# Altium footprint library CUSTOM PCB.PcbLib: 404 footprints (part 8 of 26)
Each footprint in its own frame and in the unit in brackets; x right, y up, seen from the top. Pads: shape width x height; smd on the part's side, far side on the other; paste and mask are expansions set on the pad; w line width, h text height; cw(c..) or ccw(c..) is an arc to the next point about the centre after c.
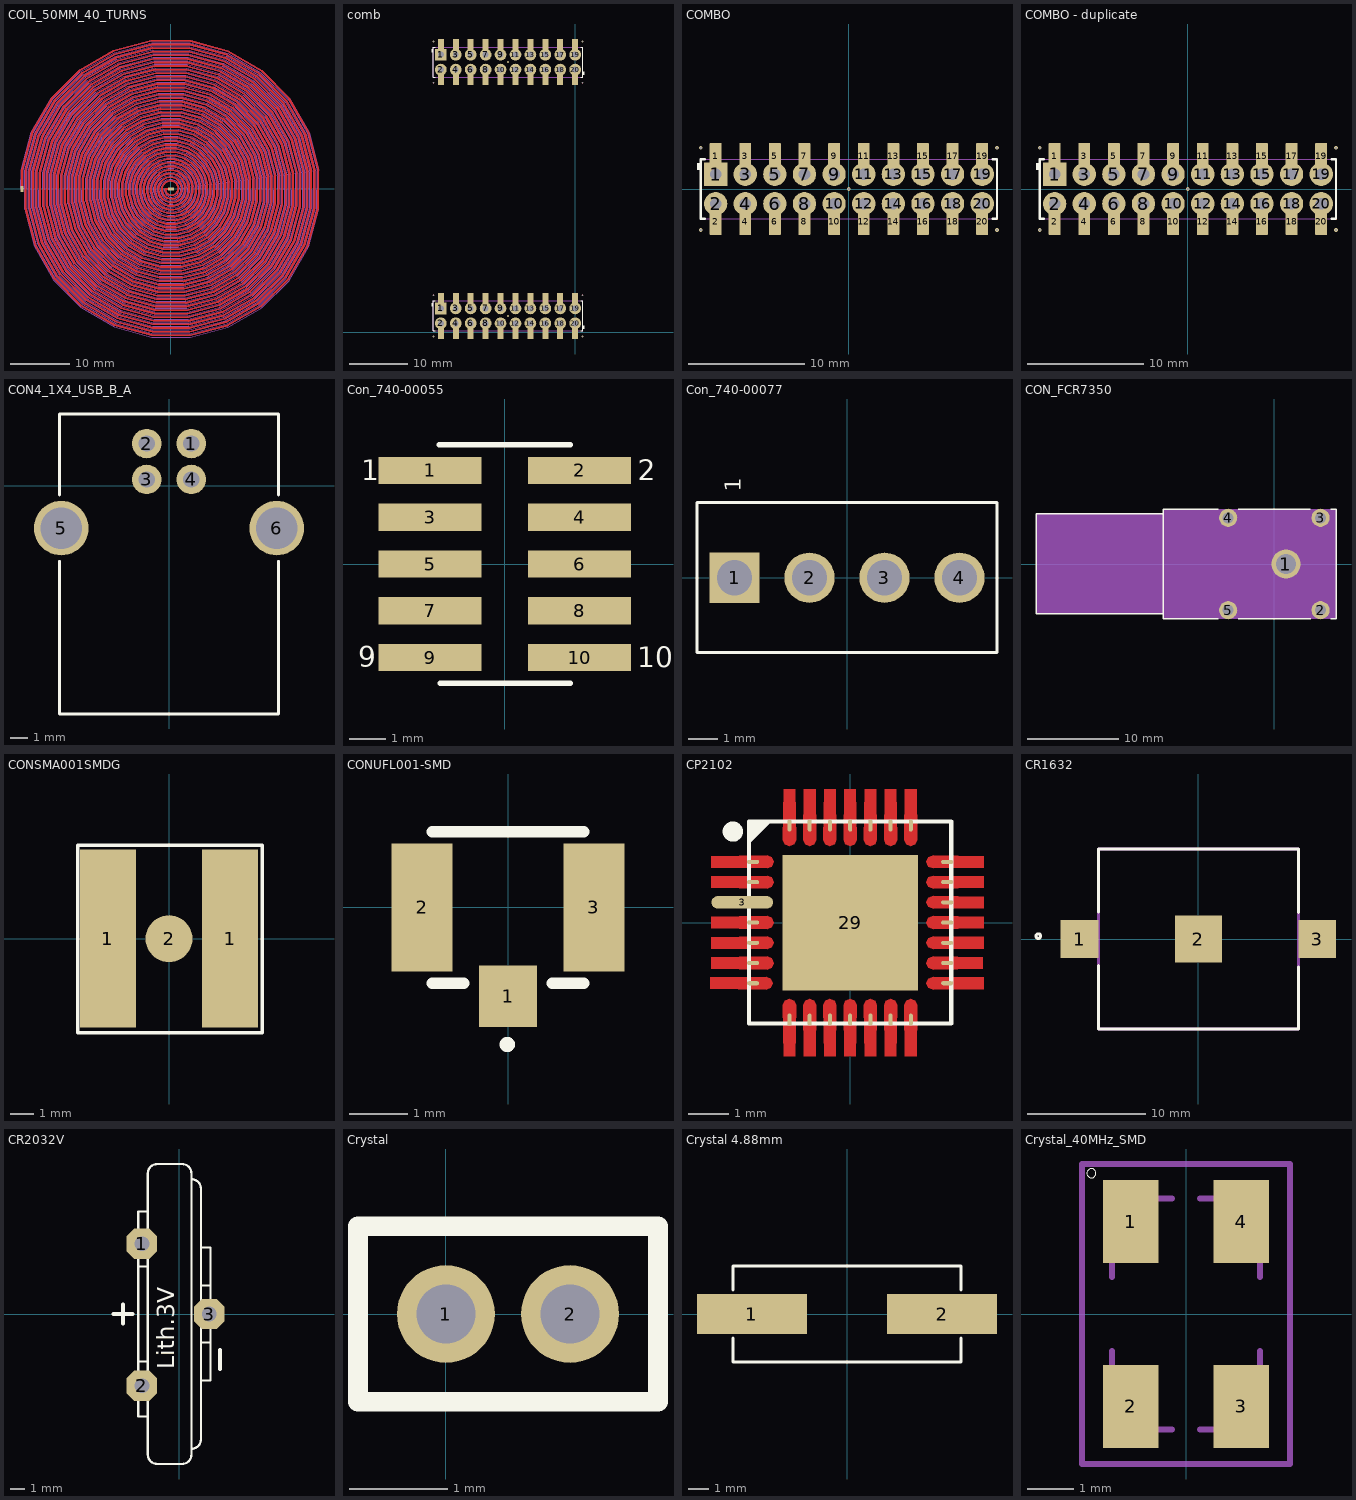
[diagram p7: the footprints below, top view; thin cyan lines are the x and y axes]

## COIL_50MM_40_TURNS [mm]
pads (2):
  rect 0.5x1 smd: 1(-24.972,0.002)
  rect 1x0.5 smd: 2(0.032,0.002)
Top Layer:
  lines w0.297: -24.972,0.002 -24.947,3.29 -23.221,9.632 -19.917,15.306 -15.261,19.927 -9.573,23.182 -3.243,24.852 3.297,24.827 9.601,23.112 15.241,19.826 19.833,15.198 23.068,9.545 24.728,3.253 24.703,-3.247 22.998,-9.513 19.733,-15.118 15.133,-19.683 9.514,-22.898 3.261,-24.547 -3.2,-24.522 -9.428,-22.828 -14.999,-19.582 -19.535,-15.01 -22.731,-9.425 -24.37,-3.21 -24.345,3.211 -22.661,9.4 -19.435,14.937 -14.891,19.445 -9.341,22.621 -3.164,24.25 3.218,24.225 9.369,22.551 14.871,19.345 19.352,14.829 22.507,9.313 24.126,3.174 24.101,-3.168 22.437,-9.28 19.251,-14.748 14.763,-19.201 9.281,-22.337 3.181,-23.945 -3.121,-23.92 -9.195,-22.267 -14.629,-19.101 -19.054,-14.641 -22.17,-9.193 -23.768,-3.131 -23.743,3.131 -22.1,9.167 -18.953,14.567 -14.521,18.963 -9.108,22.06 -3.084,23.648 3.138,23.623 9.136,21.99 14.501,18.863 18.87,14.459 21.946,9.08 23.524,3.095 23.499,-3.088 21.876,-9.048 18.77,-14.379 14.394,-18.719 9.049,-21.776 3.102,-23.343 -3.042,-23.318 -8.963,-21.706 -14.259,-18.619 -18.572,-14.271 -21.609,-8.961 -23.166,-3.052 -23.141,3.052 -21.539,8.935 -18.472,14.197 -14.152,18.482 -8.876,21.499 -3.005,23.046 3.059,23.021 8.904,21.429 14.132,18.381 18.388,14.09 21.385,8.848 22.922,3.016 22.897,-3.009 21.315,-8.816 18.288,-14.009 14.024,-18.237 8.817,-21.215 3.023,-22.741 -2.962,-22.716 -8.731,-21.145 -13.89,-18.137 -18.09,-13.901 -21.048,-8.728 -22.564,-2.973 -22.539,2.973 -20.978,8.703 -17.99,13.828 -13.782,18 -8.643,20.938 -2.926,22.444 2.98,22.419 8.672,20.868 13.762,17.9 17.906,13.72 20.824,8.616 22.32,2.936 22.295,-2.93 20.754,-8.583 17.806,-13.639 13.654,-17.756 8.584,-20.654 2.944,-22.139 -2.883,-22.114 -8.498,-20.584 -13.52,-17.655 -17.608,-13.532 -20.487,-8.496 -21.962,-2.893 -21.937,2.894 -20.417,8.47 -17.508,13.458 -13.412,17.518 -8.411,20.377 -2.847,21.842 2.901,21.817 8.439,20.307 13.393,17.418 17.425,13.35 20.264,8.383 21.718,2.857 21.693,-2.851 20.193,-8.351 17.324,-13.27 13.285,-17.274 8.352,-20.093 2.864,-21.537 -2.804,-21.512 -8.266,-20.023 -13.151,-17.174 -17.127,-13.162 -19.926,-8.264 -21.36,-2.814 -21.335,2.814 -19.856,8.238 -17.026,13.088 -13.043,17.037 -8.179,19.816 -2.767,21.24 2.821,21.215 8.207,19.746 13.023,16.936 16.943,12.981 19.703,8.151 21.116,2.778 21.091,-2.771 19.632,-8.118 16.843,-12.9 12.915,-16.792 8.12,-19.532 2.785,-20.935 -2.725,-20.91 -8.034,-19.462 -12.781,-16.692 -16.645,-12.792 -19.365,-8.031 -20.758,-2.735 -20.733,2.735 -19.295,8.006 -16.545,12.719 -12.673,16.555 -7.946,19.255 -2.688,20.638 2.742,20.613 7.974,19.185 12.653,16.455 16.461,12.611 19.142,7.919 20.514,2.699 20.489,-2.692 19.071,-7.886 16.361,-12.531 12.545,-16.311 7.887,-18.971 2.706,-20.334 -2.645,-20.308 -7.801,-18.901 -12.411,-16.21 -16.163,-12.423 -18.804,-7.799 -20.156,-2.656 -20.131,2.656 -18.734,7.773 -16.063,12.349 -12.304,16.073 -7.714,18.694 -2.609,20.036 2.663,20.011 7.742,18.624 12.284,15.973 15.98,12.241 18.581,7.686 19.912,2.619 19.887,-2.613 18.511,-7.654 15.879,-12.161 12.176,-15.829 7.655,-18.41 2.627,-19.732 -2.566,-19.706 -7.569,-18.34 -12.042,-15.729 -15.682,-12.053 -18.243,-7.567 -19.554,-2.576 -19.529,2.577 -18.173,7.541 -15.581,11.98 -11.934,15.591 -7.482,18.133 -2.53,19.434 2.584,19.409 7.51,18.063 11.914,15.491 15.498,11.872 18.02,7.454 19.31,2.54 19.285,-2.533 17.95,-7.421 15.398,-11.791 11.806,-15.347 7.423,-17.849 2.547,-19.13 -2.487,-19.104 -7.336,-17.779 -11.672,-15.247 -15.2,-11.684 -17.682,-7.334 -18.952,-2.497 -18.927,2.497 -17.612,7.309 -15.1,11.61 -11.564,15.11 -7.249,17.572 -2.45,18.832 2.504,18.807 7.277,17.502 11.544,15.009 15.016,11.502 17.459,7.221 18.708,2.461 18.683,-2.454 17.389,-7.189 14.916,-11.422 11.437,-14.866 7.19,-17.288 2.468,-18.528 -2.408,-18.502 -7.104,-17.218 -11.302,-14.765 -14.718,-11.314 -17.121,-7.102 -18.35,-2.418 -18.325,2.418 -17.051,7.076 -14.618,11.24 -11.195,14.628 -7.017,17.011 -2.371,18.23 2.425,18.205 7.045,16.941 11.175,14.528 14.535,11.133 16.898,6.989 18.106,2.382 18.081,-2.375 16.828,-6.957 14.434,-11.052 11.067,-14.384 6.958,-16.727 2.389,-17.926 -2.328,-17.901 -6.872,-16.657 -10.933,-14.283 -14.237,-10.944 -16.56,-6.87 -17.748,-2.339 -17.723,2.339 -16.49,6.844 -14.136,10.871 -10.825,14.146 -6.785,16.45 -2.292,17.628 2.346,17.603 6.813,16.38 10.805,14.046 14.053,10.763 16.337,6.757 17.504,2.302 17.479,-2.296 16.267,-6.724 13.952,-10.683 10.697,-13.902 6.726,-16.166 2.309,-17.324 -2.249,-17.299 -6.639,-16.096 -10.563,-13.802 -13.755,-10.575 -15.999,-6.637 -17.146,-2.259 -17.121,2.259 -15.929,6.612 -13.654,10.501 -10.455,13.665 -6.552,15.889 -2.213,17.026 2.267,17.001 6.58,15.819 10.436,13.564 13.571,10.393 15.776,6.524 16.902,2.223 16.877,-2.216 15.706,-6.492 13.471,-10.313 10.328,-13.42 6.493,-15.605 2.23,-16.722 -2.17,-16.697 -6.407,-15.535 -10.194,-13.32 -13.273,-10.205 -15.438,-6.405 -16.544,-2.18 -16.519,2.18 -15.368,6.379 -13.173,10.131 -10.086,13.183 -6.32,15.328 -2.133,16.424 2.187,16.399 6.348,15.258 10.066,13.083 13.089,10.024 15.215,6.292 16.3,2.144 16.275,-2.137 15.145,-6.26 12.989,-9.943 9.958,-12.939 6.261,-15.044 2.151,-16.12 -2.091,-16.095 -6.175,-14.974 -9.824,-12.838 -12.791,-9.835 -14.877,-6.173 -15.942,-2.101 -15.917,2.101 -14.807,6.147 -12.691,9.762 -9.716,12.701 -6.088,14.767 -2.054,15.822 2.108,15.797 6.116,14.697 9.696,12.601 12.608,9.654 14.654,6.06 15.698,2.065 15.673,-2.058 14.584,-6.027 12.507,-9.574 9.588,-12.457 6.029,-14.483 2.072,-15.518 -2.011,-15.493 -5.942,-14.413 -9.454,-12.357 -12.31,-9.466 -14.316,-5.94 -15.34,-2.022 -15.315,2.022 -14.246,5.914 -12.209,9.392 -9.347,12.22 -5.855,14.206 -1.975,15.22 2.029,15.195 5.883,14.136 9.327,12.119 12.126,9.284 14.093,5.827 15.096,1.985 15.071,-1.979 14.023,-5.795 12.026,-9.204 9.219,-11.975 5.796,-13.922 1.992,-14.916 -1.932,-14.891 -5.71,-13.852 -9.085,-11.875 -11.828,-9.096 -13.755,-5.708 -14.738,-1.942 -14.713,1.942 -13.685,5.682 -11.728,9.023 -8.977,11.738 -5.623,13.645 -1.896,14.618 1.95,14.593 5.651,13.575 8.957,11.638 11.644,8.915 13.532,5.595 14.494,1.906 14.469,-1.899 13.462,-5.563 11.544,-8.834 8.849,-11.494 5.564,-13.362 1.913,-14.314 -1.853,-14.289 -5.478,-13.291 -8.715,-11.393 -11.346,-8.727 -13.194,-5.475 -14.136,-1.863 -14.111,1.863 -13.124,5.45 -11.246,8.653 -8.607,11.256 -5.39,13.084 -1.816,14.016 1.87,13.991 5.419,13.014 8.587,11.156 11.163,8.545 12.971,5.363 13.893,1.827 13.867,-1.82 12.901,-5.33 11.062,-8.465 8.48,-11.012 5.331,-12.801 1.834,-13.712 -1.774,-13.687 -5.245,-12.73 -8.345,-10.912 -10.865,-8.357 -12.633,-5.243 -13.534,-1.784 -13.509,1.784 -12.563,5.217 -10.764,8.283 -8.238,10.774 -5.158,12.523 -1.737,13.414 1.791,13.389 5.186,12.453 8.218,10.674 10.681,8.176 12.41,5.13 13.291,1.748 13.265,-1.741 12.34,-5.098 10.581,-8.095 8.11,-10.53 5.099,-12.24 1.755,-13.11 -1.694,-13.085 -5.013,-12.169 -7.976,-10.43 -10.383,-7.987 -12.072,-5.011 -12.932,-1.705 -12.907,1.705 -12.002,4.985 -10.283,7.914 -7.868,10.293 -4.926,11.963 -1.658,12.812 1.712,12.787 4.954,11.892 7.848,10.192 10.199,7.806 11.849,4.898 12.689,1.668 12.663,-1.662 11.779,-4.866 10.099,-7.726 7.74,-10.049 4.867,-11.679 1.675,-12.508 -1.615,-12.483 -4.781,-11.609 -7.606,-9.948 -9.901,-7.618 -11.512,-4.778 -12.33,-1.625 -12.305,1.625 -11.441,4.753 -9.801,7.544 -7.498,9.811 -4.693,11.402 -1.579,12.21 1.633,12.185 4.722,11.331 7.479,9.711 9.718,7.436 11.288,4.666 12.087,1.589 12.061,-1.582 11.218,-4.633 9.617,-7.356 7.371,-9.567 4.634,-11.118 1.596,-11.906 -1.536,-11.881 -4.548,-11.048 -7.237,-9.466 -9.42,-7.248 -10.951,-4.546 -11.728,-1.546 -11.703,1.546 -10.88,4.52 -9.319,7.174 -7.129,9.329 -4.461,10.841 -1.499,11.608 1.553,11.583 4.489,10.77 7.109,9.229 9.236,7.067 10.727,4.433 11.485,1.51 11.459,-1.503 10.657,-4.401 9.135,-6.986 7.001,-9.085 4.402,-10.557 1.517,-11.304 -1.457,-11.279 -4.316,-10.487 -6.867,-8.985 -8.938,-6.878 -10.39,-4.314 -11.126,-1.467 -11.101,1.467 -10.319,4.288 -8.837,6.805 -6.759,8.848 -4.229,10.28 -1.42,11.006 1.474,10.981 4.257,10.21 6.739,8.747 8.754,6.697 10.166,4.201 10.883,1.431 10.858,-1.424 10.096,-4.168 8.654,-6.617 6.632,-8.603 4.17,-9.996 1.438,-10.702 -1.377,-10.677 -4.083,-9.926 -6.497,-8.503 -8.456,-6.509 -9.829,-4.081 -10.524,-1.388 -10.499,1.388 -9.759,4.056 -8.356,6.435 -6.39,8.366 -3.996,9.719 -1.341,10.404 1.395,10.379 4.024,9.649 6.37,8.266 8.272,6.327 9.605,3.969 10.281,1.351 10.256,-1.345 9.535,-3.936 8.172,-6.247 6.262,-8.122 3.937,-9.435 1.358,-10.1 -1.298,-10.075 -3.851,-9.365 -6.128,-8.021 -7.974,-6.139 -9.268,-3.849 -9.922,-1.308 -9.897,1.308 -9.198,3.823 -7.874,6.066 -6.02,7.884 -3.764,9.158 -1.262,9.802 1.316,9.777 3.792,9.088 6,7.784 7.791,5.958 9.044,3.736 9.679,1.272 9.654,-1.265 8.974,-3.704 7.69,-5.877 5.892,-7.64 3.705,-8.874 1.279,-9.498 -1.219,-9.473 -3.619,-8.804 -5.758,-7.54 -7.493,-5.77 -8.707,-3.617 -9.321,-1.229 -9.295,1.229 -8.637,3.591 -7.392,5.696 -5.65,7.403 -3.532,8.597 -1.182,9.2 1.236,9.175 3.56,8.527 5.63,7.302 7.309,5.588 8.483,3.504 9.077,1.193 9.052,-1.186 8.413,-3.471 7.209,-5.508 5.523,-7.158 3.473,-8.313 1.2,-8.896 -1.14,-8.871 -3.386,-8.243 -5.388,-7.058 -7.011,-5.4 -8.146,-3.384 -8.719,-1.15 -8.693,1.15 -8.076,3.359 -6.911,5.326 -5.281,6.921 -3.299,8.036 -1.103,8.598 1.157,8.573 3.327,7.966 5.261,6.82 6.827,5.219 7.922,3.271 8.475,1.114 8.45,-1.107 7.852,-3.239 6.727,-5.138 5.153,-6.677 3.24,-7.752 1.121,-8.294 -1.06,-8.269 -3.154,-7.682 -5.019,-6.576 -6.529,-5.03 -7.585,-3.152 -8.117,-1.071 -8.091,1.071 -7.515,3.126 -6.429,4.957 -4.911,6.439 -3.067,7.475 -1.024,7.996 1.078,7.971 3.095,7.405 4.891,6.339 6.346,4.849 7.362,3.039 7.873,1.034 7.848,-1.028 7.291,-3.007 6.245,-4.769 4.783,-6.195 3.008,-7.191 1.041,-7.692 -0.981,-7.667 -2.922,-7.121 -4.649,-6.095 -6.048,-4.661 -7.024,-2.92 -7.515,-0.991 -7.489,0.991 -6.954,2.894 -5.947,4.587 -4.541,5.957 -2.835,6.914 -0.945,7.394 0.999,7.369 2.863,6.844 4.522,5.857 5.864,4.479 6.801,2.807 7.271,0.955 7.246,-0.948 6.73,-2.774 5.764,-4.399 4.414,-5.713 2.776,-6.63 0.962,-7.09 -0.902,-7.065 -2.689,-6.56 -4.28,-5.613 -5.566,-4.291 -6.463,-2.687 -6.913,-0.912 -6.887,0.912 -6.393,2.662 -5.466,4.217 -4.172,5.476 -2.602,6.353 -0.865,6.792 0.919,6.767 2.63,6.283 4.152,5.375 5.382,4.11 6.24,2.574 6.669,0.876 6.644,-0.869 6.169,-2.542 5.282,-4.029 4.044,-5.231 2.543,-6.069 0.883,-6.488 -0.823,-6.463 -2.457,-5.999 -3.91,-5.131 -5.084,-3.921 -5.902,-2.455 -6.311,-0.833 -6.286,0.833 -5.832,2.429 -4.984,3.848 -3.802,4.994 -2.37,5.792 -0.786,6.19 0.84,6.165 2.398,5.722 3.782,4.894 4.9,3.74 5.679,2.342 6.067,0.797 6.042,-0.79 5.609,-2.31 4.8,-3.66 3.675,-4.75 2.311,-5.508 0.804,-5.886 -0.743,-5.861 -2.225,-5.438 -3.54,-4.649 -4.602,-3.552 -5.341,-2.222 -5.709,-0.754 -5.684,0.754 -5.271,2.197 -4.502,3.478 -3.433,4.512 -2.137,5.231 -0.707,5.588 0.761,5.563 2.166,5.161 3.413,4.412 4.419,3.37 5.118,2.11 5.465,0.717 5.44,-0.711 5.048,-2.077 4.318,-3.29 3.305,-4.268 2.078,-4.947 0.724,-5.284 -0.664,-5.259 -1.992,-4.877 -3.171,-4.168 -4.121,-3.182 -4.78,-1.99 -5.107,-0.674 -5.082,0.674 -4.71,1.964 -4.02,3.109 -3.063,4.031 -1.905,4.67 -0.628,4.986 0.682,4.961 1.933,4.6 3.043,3.93 3.937,3.001 4.557,1.877 4.863,0.638 4.838,-0.631 4.487,-1.845 3.837,-2.92 2.935,-3.786 1.846,-4.386 0.645,-4.682 -0.585,-4.657 -1.76,-4.316 -2.801,-3.686 -3.639,-2.813 -4.219,-1.758 -4.505,-0.595 -4.48,0.595 -4.149,1.732 -3.539,2.739 -2.693,3.549 -1.673,4.109 -0.548,4.384 0.602,4.359 1.701,4.039 2.673,3.449 3.455,2.631 3.996,1.645 4.261,0.559 4.236,-0.552 3.926,-1.613 3.355,-2.551 2.566,-3.305 1.614,-3.825 0.566,-4.08 -0.505,-4.055 -1.528,-3.755 -2.431,-3.204 -3.157,-2.443 -3.658,-1.525 -3.903,-0.516 -3.878,0.516 -3.588,1.5 -3.057,2.369 -2.324,3.067 -1.44,3.548 -0.469,3.782 0.523,3.757 1.469,3.478 2.304,2.967 2.974,2.262 3.435,1.413 3.659,0.48 3.634,-0.473 3.365,-1.38 2.873,-2.181 2.196,-2.823 1.381,-3.264 0.487,-3.478 -0.426,-3.453 -1.295,-3.194 -2.062,-2.723 -2.676,-2.073 -3.097,-1.293 -3.301,-0.437 -3.276,0.437 -3.027,1.267 -2.575,2 -1.954,2.585 -1.208,2.987 -0.39,3.18 0.444,3.155 1.236,2.917 1.934,2.485 2.492,1.892 2.874,1.18 3.057,0.4 3.032,-0.394 2.804,-1.148 2.392,-1.812 1.826,-2.341 1.149,-2.703 0.407,-2.876 -0.347,-2.851 -1.063,-2.633 -1.692,-2.241 -2.194,-1.704 -2.536,-1.061 -2.699,-0.357 -2.674,0.357 -2.466,1.035 -2.094,1.63 -1.584,2.104 -0.976,2.426 -0.311,2.578 0.365,2.553 1.004,2.356 1.565,2.003 2.01,1.522 2.313,0.948 2.455,0.321 2.43,-0.314 2.243,-0.915 1.91,-1.442 1.457,-1.86 0.917,-2.142 0.328,-2.274 -0.268,-2.249 -0.83,-2.072 -1.323,-1.759 -1.712,-1.334 -1.975,-0.828 -2.097,-0.278 -2.072,0.278 -1.905,0.803 -1.612,1.26 -1.215,1.622 -0.743,1.865 -0.231,1.977 0.285,1.951 0.771,1.795 1.195,1.522 1.529,1.153 1.752,0.716 1.853,0.242 1.828,-0.235 1.682,-0.683 1.428,-1.072 1.087,-1.378 0.684,-1.581 0.249,-1.672 -0.188,-1.647 -0.598,-1.511 -0.953,-1.277 -1.231,-0.964 -1.414,-0.596 -1.495,-0.199 -1.47,0.199 -1.344,0.57 -1.13,0.891 -0.845,1.14 -0.511,1.304 -0.152,1.375 0.206,1.349 0.539,1.234 0.825,1.04 1.047,0.783 1.191,0.483 1.251,0.163 1.226,-0.156 1.121,-0.451 0.946,-0.703 0.718,-0.896 0.452,-1.02 0.17,-1.07 -0.109,-1.045 -0.366,-0.95 -0.583,-0.796 -0.749,-0.595 -0.853,-0.364 -0.893,-0.12 -0.868,0.002 0.032,0.002
Mechanical 1:
  drawing of 2866 lines, arcs and shapes, not listed
3D body: height 0.1, standoff 0, extent -25.145,-24.864 24.868,24.844

## comb [mm]
pads (120):
  rrect10% 1.02x2.22 smd: 1(-22.86,5.605) 1(-22.86,48.785) 1(0,-0.045) 1(0,43.135) 2(-22.86,-0.045) 2(-22.86,43.135) 2(0,5.605) 2(0,48.785) 3(-20.32,5.605) 3(-20.32,48.785) 3(-2.54,-0.045) 3(-2.54,43.135) 4(-20.32,-0.045) 4(-20.32,43.135) 4(-2.54,5.605) 4(-2.54,48.785) 5(-17.78,5.605) 5(-17.78,48.785) 5(-5.08,-0.045) 5(-5.08,43.135) 6(-17.78,-0.045) 6(-17.78,43.135) 6(-5.08,5.605) 6(-5.08,48.785) 7(-15.24,5.605) 7(-15.24,48.785) 7(-7.62,-0.045) 7(-7.62,43.135) 8(-15.24,-0.045) 8(-15.24,43.135) 8(-7.62,5.605) 8(-7.62,48.785) 9(-12.7,5.605) 9(-12.7,48.785) 9(-10.16,-0.045) 9(-10.16,43.135) 10(-12.7,-0.045) 10(-12.7,43.135) 10(-10.16,5.605) 10(-10.16,48.785) 11(-12.7,-0.045) 11(-12.7,43.135) 11(-10.16,5.605) 11(-10.16,48.785) 12(-12.7,5.605) 12(-12.7,48.785) 12(-10.16,-0.045) 12(-10.16,43.135) 13(-15.24,-0.045) 13(-15.24,43.135) 13(-7.62,5.605) 13(-7.62,48.785) 14(-15.24,5.605) 14(-15.24,48.785) 14(-7.62,-0.045) 14(-7.62,43.135) 15(-17.78,-0.045) 15(-17.78,43.135) 15(-5.08,5.605) 15(-5.08,48.785) 16(-17.78,5.605) 16(-17.78,48.785) 16(-5.08,-0.045) 16(-5.08,43.135) 17(-20.32,-0.045) 17(-20.32,43.135) 17(-2.54,5.605) 17(-2.54,48.785) 18(-20.32,5.605) 18(-20.32,48.785) 18(-2.54,-0.045) 18(-2.54,43.135) 19(-22.86,-0.045) 19(-22.86,43.135) 19(0,5.605) 19(0,48.785) 20(-22.86,5.605) 20(-22.86,48.785) 20(0,-0.045) 20(0,43.135)
  rect 2x2 hole 1: 1(-22.859,4.05) 1(-22.859,47.23)
  round 2 hole 1: 2(-22.859,1.51) 2(-22.859,44.69) 3(-20.319,4.05) 3(-20.319,47.23) 4(-20.319,1.51) 4(-20.319,44.69) 5(-17.779,4.05) 5(-17.779,47.23) 6(-17.779,1.51) 6(-17.779,44.69) 7(-15.239,4.05) 7(-15.239,47.23) 8(-15.239,1.51) 8(-15.239,44.69) 9(-12.699,4.05) 9(-12.699,47.23) 10(-12.699,1.51) 10(-12.699,44.69) 11(-10.159,4.05) 11(-10.159,47.23) 12(-10.159,1.51) 12(-10.159,44.69) 13(-7.619,4.05) 13(-7.619,47.23) 14(-7.619,1.51) 14(-7.619,44.69) 15(-5.079,4.05) 15(-5.079,47.23) 16(-5.079,1.51) 16(-5.079,44.69) 17(-2.539,4.05) 17(-2.539,47.23) 18(-2.539,1.51) 18(-2.539,44.69) 19(0.001,4.05) 19(0.001,47.23) 20(0.001,1.51) 20(0.001,44.69)
via -24.13,42.442 diameter 0.305 hole 0.203
via -24.13,49.478 diameter 0.305 hole 0.203
via 1.27,49.478 diameter 0.305 hole 0.203
via 1.27,42.442 diameter 0.305 hole 0.203
via -11.43,45.96 diameter 0.305 hole 0.203
via -24.13,-0.738 diameter 0.305 hole 0.203
via -24.13,6.298 diameter 0.305 hole 0.203
via 1.27,6.298 diameter 0.305 hole 0.203
via 1.27,-0.738 diameter 0.305 hole 0.203
via -11.43,2.78 diameter 0.305 hole 0.203
Top Overlay:
  rectangle: -24.454,47.585 -24.104,48.185
  rectangle: -24.454,4.405 -24.104,5.005
  region: 1.595,1.155 1.245,1.155 1.245,0.555 1.595,0.555
  region: 1.595,44.335 1.245,44.335 1.245,43.735 1.595,43.735
  lines w0.2: -24.13,0.24 -24.13,5.32 ; -24.13,0.24 -23.77,0.24 -24.13,0.24 ; -24.13,0.24 -24.13,5.32 ; -24.13,5.32 -23.77,5.32 -24.13,5.32 ; -24.13,43.42 -24.13,48.5 ; -24.13,43.42 -23.77,43.42 -24.13,43.42 ; -24.13,43.42 -24.13,48.5 ; -24.13,48.5 -23.77,48.5 -24.13,48.5 ; 1.27,0.24 0.91,0.24 1.27,0.24 ; 1.27,0.24 1.27,5.32 ; 1.27,0.24 1.27,5.32 ; 1.27,5.32 0.91,5.32 1.27,5.32 ; 1.27,43.42 0.91,43.42 1.27,43.42 ; 1.27,43.42 1.27,48.5 ; 1.27,43.42 1.27,48.5 ; 1.27,48.5 0.91,48.5 1.27,48.5
Mechanical 6:
  drawing of 256 lines, arcs and shapes, not listed
  text ".Designator" at -11.612,45.988 h1.02
  text ".Designator" at -11.612,2.808 h1.02
  text ".Designator" at -11.248,2.752 h1.02
  text ".Designator" at -11.248,45.932 h1.02
3D body "SSM-110-S-DV.stp": height 7.42, standoff 0, extent -24.13,-0.738 1.27,6.298
3D body "SSM-110-S-DV.stp": height 7.42, standoff 0, extent -24.13,42.442 1.27,49.478
3D body "SSM-110-S-DV.stp": height 7.42, standoff 0, extent -24.13,42.442 1.27,49.478
3D body "ZW-10-15-S-D-290-118.x_t": height 13, standoff -3, extent -24.129,43.42 1.271,48.5
3D body "SSM-110-S-DV.stp": height 7.42, standoff 0, extent -24.13,-0.738 1.27,6.298
3D body "ZW-10-15-S-D-290-118.x_t": height 8, standoff -8, extent -24.13,0.24 1.27,5.32

## COMBO [mm]
pads (40):
  rrect10% 1.02x2.22 smd: 1(-11.43,2.825) 2(-11.43,-2.825) 3(-8.89,2.825) 4(-8.89,-2.825) 5(-6.35,2.825) 6(-6.35,-2.825) 7(-3.81,2.825) 8(-3.81,-2.825) 9(-1.27,2.825) 10(-1.27,-2.825) 11(1.27,2.825) 12(1.27,-2.825) 13(3.81,2.825) 14(3.81,-2.825) 15(6.35,2.825) 16(6.35,-2.825) 17(8.89,2.825) 18(8.89,-2.825) 19(11.43,2.825) 20(11.43,-2.825)
  rect 2x2 hole 1: 1(-11.43,1.27)
  round 2 hole 1: 2(-11.43,-1.27) 3(-8.89,1.27) 4(-8.89,-1.27) 5(-6.35,1.27) 6(-6.35,-1.27) 7(-3.81,1.27) 8(-3.81,-1.27) 9(-1.27,1.27) 10(-1.27,-1.27) 11(1.27,1.27) 12(1.27,-1.27) 13(3.81,1.27) 14(3.81,-1.27) 15(6.35,1.27) 16(6.35,-1.27) 17(8.89,1.27) 18(8.89,-1.27) 19(11.43,1.27) 20(11.43,-1.27)
via -12.7,-3.518 diameter 0.305 hole 0.203
via -12.7,3.518 diameter 0.305 hole 0.203
via 12.7,3.518 diameter 0.305 hole 0.203
via 12.7,-3.518 diameter 0.305 hole 0.203
via 0,0 diameter 0.305 hole 0.203
Top Overlay:
  rectangle: -13.025,1.625 -12.675,2.225
  lines w0.2: -12.34,-2.54 -12.7,-2.54 -12.7,2.54 -12.34,2.54 ; 12.34,-2.54 12.7,-2.54 12.7,2.54 12.34,2.54
Mechanical 6:
  lines w0.1: -11.684,-2.54 -11.684,-3.518 -11.176,-3.518 -11.176,-2.54 ; -11.684,2.54 -11.684,3.518 -11.176,3.518 -11.176,2.54 ; -9.144,-2.54 -9.144,-3.518 -8.636,-3.518 -8.636,-2.54 ; -9.144,2.54 -9.144,3.518 -8.636,3.518 -8.636,2.54 ; -6.604,-2.54 -6.604,-3.518 -6.096,-3.518 -6.096,-2.54 ; -6.604,2.54 -6.604,3.518 -6.096,3.518 -6.096,2.54 ; -4.064,-2.54 -4.064,-3.518 -3.556,-3.518 -3.556,-2.54 ; -4.064,2.54 -4.064,3.518 -3.556,3.518 -3.556,2.54 ; -1.524,-2.54 -1.524,-3.518 -1.016,-3.518 -1.016,-2.54 ; -1.524,2.54 -1.524,3.518 -1.016,3.518 -1.016,2.54 ; 1.016,-2.54 1.016,-3.518 1.524,-3.518 1.524,-2.54 ; 1.016,2.54 1.016,3.518 1.524,3.518 1.524,2.54 ; 3.556,-2.54 3.556,-3.518 4.064,-3.518 4.064,-2.54 ; 3.556,2.54 3.556,3.518 4.064,3.518 4.064,2.54 ; 6.096,-2.54 6.096,-3.518 6.604,-3.518 6.604,-2.54 ; 6.096,2.54 6.096,3.518 6.604,3.518 6.604,2.54 ; 8.636,-2.54 8.636,-3.518 9.144,-3.518 9.144,-2.54 ; 8.636,2.54 8.636,3.518 9.144,3.518 9.144,2.54 ; 11.176,-2.54 11.176,-3.518 11.684,-3.518 11.684,-2.54 ; 11.176,2.54 11.176,3.518 11.684,3.518 11.684,2.54 ; -12.7,-2.54 -12.7,2.54 12.7,2.54 12.7,-2.54 -12.7,-2.54
  text ".Designator" at -0.182,0.028 h1.02
3D body "ZW-10-15-S-D-290-118.x_t": height 8, standoff -8, extent -10.617,19.431 14.783,24.511
3D body "SSM-110-S-DV.stp": height 7.42, standoff 0, extent -12.7,-3.518 12.7,3.518
3D body "ZW-10-15-S-D-290-118.x_t": height 13, standoff -3, extent -12.7,-2.54 12.7,2.54

## COMBO - duplicate [mm]
pads (40):
  rrect10% 1.02x2.22 smd: 1(-11.43,2.825) 2(-11.43,-2.825) 3(-8.89,2.825) 4(-8.89,-2.825) 5(-6.35,2.825) 6(-6.35,-2.825) 7(-3.81,2.825) 8(-3.81,-2.825) 9(-1.27,2.825) 10(-1.27,-2.825) 11(1.27,2.825) 12(1.27,-2.825) 13(3.81,2.825) 14(3.81,-2.825) 15(6.35,2.825) 16(6.35,-2.825) 17(8.89,2.825) 18(8.89,-2.825) 19(11.43,2.825) 20(11.43,-2.825)
  rect 2x2 hole 1: 1(-11.43,1.27)
  round 2 hole 1: 2(-11.43,-1.27) 3(-8.89,1.27) 4(-8.89,-1.27) 5(-6.35,1.27) 6(-6.35,-1.27) 7(-3.81,1.27) 8(-3.81,-1.27) 9(-1.27,1.27) 10(-1.27,-1.27) 11(1.27,1.27) 12(1.27,-1.27) 13(3.81,1.27) 14(3.81,-1.27) 15(6.35,1.27) 16(6.35,-1.27) 17(8.89,1.27) 18(8.89,-1.27) 19(11.43,1.27) 20(11.43,-1.27)
via 0,0 diameter 0.305 hole 0.203
via 12.7,-3.518 diameter 0.305 hole 0.203
via 12.7,3.518 diameter 0.305 hole 0.203
via -12.7,3.518 diameter 0.305 hole 0.203
via -12.7,-3.518 diameter 0.305 hole 0.203
Top Overlay:
  rectangle: -13.025,1.625 -12.675,2.225
  lines w0.2: -12.34,-2.54 -12.7,-2.54 -12.7,2.54 -12.34,2.54 ; 12.34,-2.54 12.7,-2.54 12.7,2.54 12.34,2.54
Mechanical 6:
  lines w0.1: -11.684,-2.54 -11.684,-3.518 -11.176,-3.518 -11.176,-2.54 ; -11.684,2.54 -11.684,3.518 -11.176,3.518 -11.176,2.54 ; -9.144,-2.54 -9.144,-3.518 -8.636,-3.518 -8.636,-2.54 ; -9.144,2.54 -9.144,3.518 -8.636,3.518 -8.636,2.54 ; -6.604,-2.54 -6.604,-3.518 -6.096,-3.518 -6.096,-2.54 ; -6.604,2.54 -6.604,3.518 -6.096,3.518 -6.096,2.54 ; -4.064,-2.54 -4.064,-3.518 -3.556,-3.518 -3.556,-2.54 ; -4.064,2.54 -4.064,3.518 -3.556,3.518 -3.556,2.54 ; -1.524,-2.54 -1.524,-3.518 -1.016,-3.518 -1.016,-2.54 ; -1.524,2.54 -1.524,3.518 -1.016,3.518 -1.016,2.54 ; 1.016,-2.54 1.016,-3.518 1.524,-3.518 1.524,-2.54 ; 1.016,2.54 1.016,3.518 1.524,3.518 1.524,2.54 ; 3.556,-2.54 3.556,-3.518 4.064,-3.518 4.064,-2.54 ; 3.556,2.54 3.556,3.518 4.064,3.518 4.064,2.54 ; 6.096,-2.54 6.096,-3.518 6.604,-3.518 6.604,-2.54 ; 6.096,2.54 6.096,3.518 6.604,3.518 6.604,2.54 ; 8.636,-2.54 8.636,-3.518 9.144,-3.518 9.144,-2.54 ; 8.636,2.54 8.636,3.518 9.144,3.518 9.144,2.54 ; 11.176,-2.54 11.176,-3.518 11.684,-3.518 11.684,-2.54 ; 11.176,2.54 11.176,3.518 11.684,3.518 11.684,2.54 ; -12.7,-2.54 12.7,-2.54 12.7,2.54 -12.7,2.54 -12.7,-2.54
  text ".Designator" at -0.182,0.028 h1.02
3D body "ZW-10-15-S-D-290-118.x_t": height 13, standoff -3, extent -12.7,-2.54 12.7,2.54
3D body "SSM-110-S-DV.stp": height 7.42, standoff 0, extent -12.7,-3.518 12.7,3.518

## CON4_1X4_USB_B_A [mil]
pads (6):
  round 65 hole 36: 1(49,93) 2(-49,93) 3(-49,14) 4(49,14)
  round 120 hole 91: 5(-237,-93) 6(237,-93)
Top Overlay:
  lines w6: -241,-165.99 -241,-502 241,-502 241,-165.99 ; -241,-20.01 -241,158 241,158 241,-20.01
3D body "61400416121.stp": height 430.63, standoff -154.37, extent -294.66,-500 294.66,149.6

## Con_740-00055 [mm]
pads (10):
  rect 2.8x0.74 smd: 1(-2.03,2.54) 2(2.03,2.54) 3(-2.03,1.27) 4(2.03,1.27) 5(-2.03,0) 6(2.03,0) 7(-2.03,-1.27) 8(2.03,-1.27) 9(-2.03,-2.54) 10(2.03,-2.54)
Top Overlay:
  lines w0.15: -1.78,3.24 1.78,3.24 ; -1.76,-3.24 1.78,-3.24
  text "1" at -3.893,2.28 h0.55
  text "9" at -3.987,-2.786 h0.55
  text "10" at 3.599,-2.805 h0.55
  text "2" at 3.608,2.279 h0.55
3D body "M50-3600542.STEP": height 4.63, standoff -0.05, extent -2.75,-3.175 2.75,3.175
3D body "CON10_2X5_DU_FTSH-M.step": height 5.97, standoff 0, extent -3.124,-3.175 3.124,3.175

## Con_740-00077 [mm]
pads (4):
  rect 1.7x1.7 hole 1.2: 1(-3.81,0)
  round 1.7 hole 1.2: 2(-1.27,0) 3(1.27,0) 4(3.81,0)
Top Overlay:
  lines w0.102: 5.055,-2.54 -5.08,-2.54 -5.08,2.54 5.08,2.54 5.08,-2.54
  text "1" at -3.601,2.916 h0.55

## CON_FCR7350 [mm]
pads (5):
  round 3.2 / inner round 3 / far side round 3.2 hole 2.2: 1(1.28,0)
  round 2 hole 1.2: 2(5.08,-5.08) 3(5.08,5.08) 4(-5.08,5.08) 5(-5.08,-5.08)
Top Overlay:
  lines w0.15: -12.22,-5.5 -26.22,-5.5 -26.22,5.5 -12.22,5.5 ; -6.17,-6 -12.22,-6 -12.22,6 -6.145,6 ; -3.995,-6 3.98,-6 ; -3.995,6 3.93,6 ; 6.23,-6 6.78,-6 6.78,6 6.23,6
Mechanical 17:
  pour cut-out: 2.087,0 2.059,0.209 1.979,0.403 1.851,0.571 1.683,0.699 1.489,0.779 1.28,0.807 1.071,0.779 0.877,0.699 0.709,0.571 0.581,0.403 0.501,0.209 0.473,0 0.501,-0.209 0.581,-0.403 0.709,-0.571 0.877,-0.699 1.071,-0.779 1.28,-0.807 1.489,-0.779 1.683,-0.699 1.851,-0.571 1.979,-0.403 2.059,-0.209
  pour cut-out: 5.488,-5.08 5.457,-4.924 5.368,-4.792 5.236,-4.703 5.08,-4.672 4.924,-4.703 4.792,-4.792 4.703,-4.924 4.672,-5.08 4.703,-5.236 4.792,-5.368 4.924,-5.457 5.08,-5.488 5.236,-5.457 5.368,-5.368 5.457,-5.236
  pour cut-out: 5.488,5.08 5.457,5.236 5.368,5.368 5.236,5.457 5.08,5.488 4.924,5.457 4.792,5.368 4.703,5.236 4.672,5.08 4.703,4.924 4.792,4.792 4.924,4.703 5.08,4.672 5.236,4.703 5.368,4.792 5.457,4.924
  pour cut-out: -4.672,5.08 -4.703,5.236 -4.792,5.368 -4.924,5.457 -5.08,5.488 -5.236,5.457 -5.368,5.368 -5.457,5.236 -5.488,5.08 -5.457,4.924 -5.368,4.792 -5.236,4.703 -5.08,4.672 -4.924,4.703 -4.792,4.792 -4.703,4.924
  pour cut-out: -4.672,-5.08 -4.703,-4.924 -4.792,-4.792 -4.924,-4.703 -5.08,-4.672 -5.236,-4.703 -5.368,-4.792 -5.457,-4.924 -5.488,-5.08 -5.457,-5.236 -5.368,-5.368 -5.236,-5.457 -5.08,-5.488 -4.924,-5.457 -4.792,-5.368 -4.703,-5.236
Mechanical 18:
  region: 6.78,-6 6.78,6 -12.22,6 -12.22,-6
  region: -12.22,-5.5 -12.22,5.5 -26.22,5.5 -26.22,-5.5
Mechanical 19:
  pour cut-out: 6.78,-6 -12.22,-6 -12.22,-5.5 -26.22,-5.5 -26.22,5.5 -12.22,5.5 -12.22,6 6.78,6
Mechanical 21:
  text "HEIGTH=12.3mm" at 0.603,0.825 h0.64
  text "DFA=NC-THRU-TALL" at -1.259,0.175 h0.64
  text "740-00XXX" at -2.981,0.025 h0.64
Mechanical 22:
  text "1.0" at 0.518,0 h0.64

## CONSMA001SMDG [mm]
pads (3):
  rect 2.44x7.76 smd: 1(-2.66,0) 1(2.66,0)
  round 2.05 smd: 2(0,0)
Top Overlay:
  lines w0.152: -3.988,-4.089 -3.988,4.064 4.064,4.064 4.064,-4.089 -3.988,-4.089
3D body "SMA surface mount jack.stp": height 9.8, standoff -0.07, extent -3.175,-3.175 3.175,3.175

## CONUFL001-SMD [mm]
pads (3):
  rect 1x1.05 smd: 1(0,-1.525)
  rect 1.05x2.2 smd: 2(-1.475,0) 3(1.475,0)
Top Overlay:
  circle w0.2: c-0.013,-2.353 r0.031
  lines w0.2: -1.3,-1.3 -0.761,-1.3 ; -1.3,1.3 1.3,1.3 ; 0.761,-1.3 1.3,-1.3
3D body "User Library-U_FL-R-SMT(10).x_t": height 1.2, standoff -0.05, extent -1.5,-1.55 1.5,1.55

## CP2102 [mm]
pads (29):
  oval 0.3x0.1 smd: 1(-2.4,1.5) 2(-2.4,1) 4(-2.4,0) 5(-2.4,-0.5) 6(-2.4,-1) 7(-2.4,-1.5) 15(2.4,-1.5) 16(2.4,-1) 17(2.4,-0.5) 18(2.4,0) 19(2.4,0.5) 20(2.4,1) 21(2.4,1.5)
  oval 1.524x0.305 smd: 3(-2.667,0.5)
  oval 0.1x0.3 smd: 8(-1.5,-2.4) 9(-1,-2.4) 10(-0.5,-2.4) 11(0,-2.4) 12(0.5,-2.4) 13(1,-2.4) 14(1.5,-2.4) 22(1.5,2.4) 23(1,2.4) 24(0.5,2.4) 25(0,2.4) 26(-0.5,2.4) 27(-1,2.4) 28(-1.5,2.4)
  rrect0% 3.35x3.35 smd: 29(0,0)
Top Layer:
  region: -1.356,3.302 -1.338,2.05 -1.385,1.935 -1.5,1.888 -1.615,1.935 -1.662,2.05 -1.644,3.302
  region: -0.856,3.302 -0.838,2.05 -0.885,1.935 -1,1.888 -1.115,1.935 -1.162,2.05 -1.144,3.302
  region: -0.356,3.302 -0.338,2.05 -0.385,1.935 -0.5,1.888 -0.615,1.935 -0.662,2.05 -0.644,3.302
  region: 0.144,3.302 0.162,2.05 0.115,1.935 0,1.888 -0.115,1.935 -0.162,2.05 -0.144,3.302
  region: 0.644,3.302 0.662,2.05 0.615,1.935 0.5,1.888 0.385,1.935 0.338,2.05 0.356,3.302
  region: 1.144,3.302 1.162,2.05 1.115,1.935 1,1.888 0.885,1.935 0.838,2.05 0.856,3.302
  region: 1.644,3.302 1.662,2.05 1.615,1.935 1.5,1.888 1.385,1.935 1.338,2.05 1.356,3.302
  region: 3.302,1.356 2.05,1.338 1.935,1.385 1.888,1.5 1.935,1.615 2.05,1.662 3.302,1.644
  region: 3.302,0.856 2.05,0.838 1.935,0.885 1.888,1 1.935,1.115 2.05,1.162 3.302,1.144
  region: 3.302,0.356 2.05,0.338 1.935,0.385 1.888,0.5 1.935,0.615 2.05,0.662 3.302,0.644
  region: 3.302,-0.144 2.05,-0.162 1.935,-0.115 1.888,0 1.935,0.115 2.05,0.162 3.302,0.144
  region: 3.302,-0.644 2.05,-0.662 1.935,-0.615 1.888,-0.5 1.935,-0.385 2.05,-0.338 3.302,-0.356
  region: 3.277,-1.145 2.05,-1.162 1.935,-1.115 1.888,-1 1.935,-0.885 2.05,-0.838 3.277,-0.855
  region: 3.302,-1.644 2.05,-1.662 1.935,-1.615 1.888,-1.5 1.935,-1.385 2.05,-1.338 3.302,-1.356
  region: 1.356,-3.302 1.338,-2.05 1.385,-1.935 1.5,-1.888 1.615,-1.935 1.662,-2.05 1.644,-3.302
  region: 0.856,-3.302 0.838,-2.05 0.885,-1.935 1,-1.888 1.115,-1.935 1.162,-2.05 1.144,-3.302
  region: 0.356,-3.302 0.338,-2.05 0.385,-1.935 0.5,-1.888 0.615,-1.935 0.662,-2.05 0.644,-3.302
  region: -0.144,-3.302 -0.162,-2.05 -0.115,-1.935 0,-1.888 0.115,-1.935 0.162,-2.05 0.144,-3.302
  region: -0.644,-3.302 -0.662,-2.05 -0.615,-1.935 -0.5,-1.888 -0.385,-1.935 -0.338,-2.05 -0.356,-3.302
  region: -1.144,-3.302 -1.162,-2.05 -1.115,-1.935 -1,-1.888 -0.885,-1.935 -0.838,-2.05 -0.856,-3.302
  region: -1.644,-3.302 -1.662,-2.05 -1.615,-1.935 -1.5,-1.888 -1.385,-1.935 -1.338,-2.05 -1.356,-3.302
  region: -3.457,-1.356 -2.08,-1.336 -1.965,-1.384 -1.917,-1.499 -1.965,-1.613 -2.08,-1.661 -3.457,-1.641
  region: -3.429,-0.858 -2.05,-0.838 -1.935,-0.885 -1.888,-1 -1.935,-1.115 -2.05,-1.162 -3.429,-1.142
  region: -3.429,-0.358 -2.05,-0.338 -1.935,-0.385 -1.888,-0.5 -1.935,-0.615 -2.05,-0.662 -3.429,-0.642
  region: -3.429,0.142 -2.05,0.162 -1.935,0.115 -1.888,0 -1.935,-0.115 -2.05,-0.162 -3.429,-0.142
  region: -3.429,1.142 -2.05,1.162 -1.935,1.115 -1.888,1 -1.935,0.885 -2.05,0.838 -3.429,0.858
  region: -3.429,1.642 -2.05,1.662 -1.935,1.615 -1.888,1.5 -1.935,1.385 -2.05,1.338 -3.429,1.358
Top Overlay:
  circle w0.25: c-2.9,2.25 r0.125
  pour cut-out: 2.819,-4.115
  pour cut-out: -3.429,1.642
  lines w0.1: -2.489,2.022 -2.007,2.497 ; -2.482,2.413 -2.344,2.456 ; -2.469,2.329 -2.344,2.456 ; -2.461,2.207 -2.205,2.456 -2.344,2.456 ; -2.459,2.139 -2.098,2.489 ; -2.499,-2.499 2.499,-2.499 2.499,2.497 -2.499,2.497 -2.499,-2.499
3D body "CP2102N-A01-GQFN28.stp": height 0.8, standoff 0, extent -2.54,-2.56 2.56,2.54

## CR1632 [mm] "3012 keystone"
pads (3):
  rect 3.18x3.18 smd: 1(-10.02,0) 3(10.02,0)
  rect 3.96x3.96 smd: 2(0,0)
Top Overlay:
  circle w0.254: c-13.496,0.246 r0.195
  lines w0.254: -8.43,-2.221 -8.43,-7.585 8.43,-7.585 8.43,-2.366 ; -8.43,2.277 -8.43,7.585 8.43,7.585 8.43,2.241
Mechanical 15:
  lines w0.254: -8.43,-7.585 8.43,-7.585 8.43,7.585 -8.43,7.585 -8.43,-7.585
3D body "User Library-keystone-PN3016.STEP": height 3.95, standoff -0.01, extent -11.659,-8.788 11.558,6.29

## CR2032V [mil] "CR2032V"
height 950
pads (3):
  oct 80x80 hole 39: 1(-98.43,185.04) 2(-98.43,-188.98) 3(78.74,0)
Top Overlay:
  lines w6: 32.13,-355 ccw(c32.13,-330) 57.13,-330 57.13,-175 ; 32.13,355 cw(c32.13,330) 57.13,330 57.13,175 ; -107.87,-125 -107.87,-270 -82.87,-270 ; -107.87,-125 -82.87,-125 ; -107.87,-125 -107.87,125 ; -107.87,125 -107.87,270 -82.87,270 ; -107.87,125 -82.87,125 ; -82.87,-270 -82.87,-125 ; -82.87,-270 -82.87,-370 ccw(c-57.87,-370) -57.87,-395 7.13,-395 ccw(c7.13,-370) 32.13,-370 32.13,-45 32.13,45 32.13,370 ccw(c7.13,370) 7.13,395 -57.87,395 ccw(c-57.87,370) -82.87,370 -82.87,270 ; -82.87,-125 -82.87,125 ; -82.87,125 -82.87,270 ; 57.13,-175 82.13,-175 82.13,-75 ; 57.13,-175 57.13,-75 ; 57.13,-75 57.13,75 ; 57.13,-75 82.13,-75 ; 57.13,75 57.13,175 ; 57.13,75 82.13,75 ; 57.13,175 82.13,175 82.13,75 ; 82.13,-75 82.13,75
  lines w10: -172.87,0 -122.87,0 ; -147.87,-25 -147.87,25 ; 107.13,-145 107.13,-95
  text "Lith.3V" at 2.13,-145 h77.5
3D body: height 949.88, standoff 50.12, extent -129.92,-443.3 110.08,456.7
3D body: height 200, standoff 1, extent -127.95,-285.43 112.21,285.44

## Crystal [mm] "Connector; Header; 2 Position, 0.6D"
pads (2):
  round 1 hole 0.6: 1(0,0) 2(1.27,0)
Top Overlay:
  lines w0.2: -0.9,-0.9 2.17,-0.9 2.17,0.9 -0.9,0.9 -0.9,-0.9
3D body "ABRACON_AB26TRB.STEP": height 6.25, standoff -2.75, extent -0.82,-1.05 2.02,1.05

## Crystal 4.88mm [mm] "Crystal, Thru-Hole; 2 Leads; Body 3.1 x 8.2 mm (Dia.xH)"
height 8.2
pads (2):
  rect 5.5x2 smd: 1(-4.75,0) 2(4.75,0)
Top Overlay:
  lines w0.152: -5.69,-1.194 -5.69,-2.4 0,-2.4 5.69,-2.4 5.69,-1.194 ; -5.69,1.194 -5.69,2.4 5.69,2.4 5.69,1.194

## Crystal_40MHz_SMD [mm]
pads (4):
  rect 1.2x1.8 smd: 1(-1.2,2) 2(-1.2,-2) 3(1.2,-2) 4(1.2,2)
Top Overlay:
  circle w0: c-2.05,3.05 r0.1
Mechanical 1:
  lines w0.127: -1.6,-0.8 -1.6,-2.2 cw(c-1.6,-2.5) -1.3,-2.5 -0.3,-2.5 ; -1.6,0.8 -1.6,2.2 ccw(c-1.6,2.5) -1.3,2.5 -0.3,2.5 ; 0.3,-2.5 1.3,-2.5 cw(c1.6,-2.5) 1.6,-2.2 1.6,-0.8 ; 0.3,2.5 1.3,2.5 ccw(c1.6,2.5) 1.6,2.2 1.6,0.8
Mechanical 4:
  lines w0.127: -2.25,-3.25 2.25,-3.25 2.25,3.25 -2.25,3.25 -2.25,-3.25
3D body "User Library-ABM3B.STEP": height 1.03, standoff -0.06, extent -1.61,-2.52 1.59,2.48
3D body: height 0.25, standoff 0, extent -0.254,1.143 -0.254,1.143